# Altium footprint library TarabusLib_KOR.PcbLib: 560 footprints (part 15 of 35)
Each footprint in its own frame and in the unit in brackets; x right, y up, seen from the top. Pads: shape width x height; smd on the part's side, far side on the other; paste and mask are expansions set on the pad; w line width, h text height; cw(c..) or ccw(c..) is an arc to the next point about the centre after c.
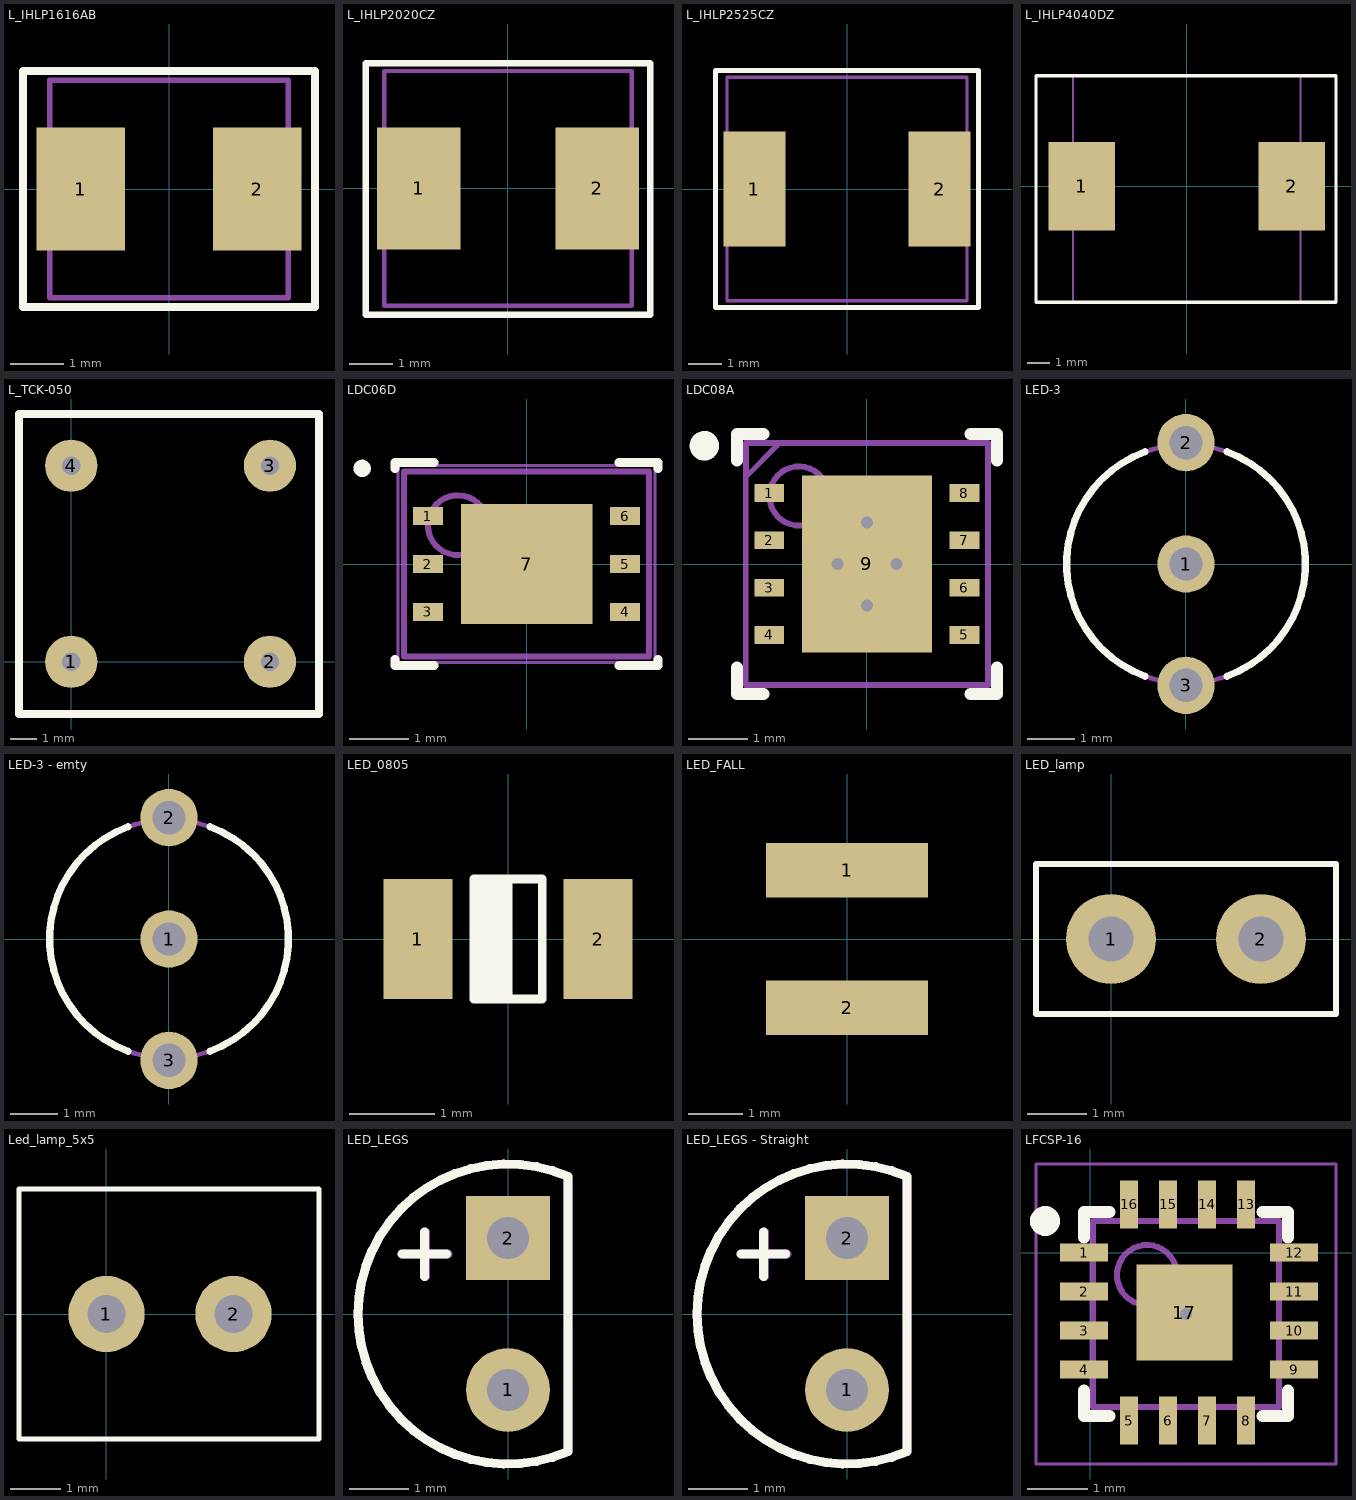
[diagram p14: the footprints below, top view; thin cyan lines are the x and y axes]

## L_IHLP1616AB [mm]
height 1
pads (2):
  rect 1.65x2.3 smd: 1(-1.65,0) 2(1.65,0)
Top Overlay:
  lines w0.15: -2.725,-2.2 -2.725,2.2 2.725,2.2 2.725,-2.2 -2.725,-2.2
Mechanical 7:
  lines w0.1: -2.225,-2.03 2.225,-2.03 2.225,2.03 -2.225,2.03 -2.225,-2.03
Mechanical 10:
  text ".Designator" at -1.425,1.55 h0.8
  text ".Comment" at -1.425,-1.875 h0.6
3D body: height 1.2, standoff 0.05, extent -2.225,-2.025 2.225,2.025

## L_IHLP2020CZ [mm]
height 3
pads (2):
  rect 1.925x2.8 smd: 1(-2.05,0) 2(2.05,0)
Top Overlay:
  lines w0.15: -3.275,-2.9 3.275,-2.9 3.275,2.875 -3.275,2.875 -3.275,-2.9
Mechanical 7:
  lines w0.1: 2.85,-2.7 -2.85,-2.7 -2.85,2.7 2.85,2.7 2.85,-2.7 ; 2.85,-2.7 2.85,-2.7
Mechanical 10:
  text ".Comment" at -1.125,-3.525 h0.6
  text ".Designator" at -1.475,3.125 h0.8
3D body: height 3, standoff 0.05, extent -2.85,-2.7 2.85,2.7

## L_IHLP2525CZ [mm]
height 3
pads (2):
  rect 1.85x3.45 smd: 1(-2.775,0) 2(2.775,0)
Top Overlay:
  lines w0.15: -3.95,-3.55 3.95,-3.55 3.95,3.55 -3.95,3.55 -3.95,-3.55
Mechanical 9:
  text ".Designator" at -1.2,3.9 h0.8
  text ".Comment" at -1.2,-4.3 h0.8
Mechanical 11:
  lines w0.1: -3.6,-3.35 3.6,-3.35 3.6,3.35 -3.6,3.35 -3.6,-3.35
3D body: height 3, standoff 0.05, extent -3.6,-3.35 3.6,3.35

## L_IHLP4040DZ [mm]
height 4
pads (2):
  rect 3x4 smd: 1(-4.75,0) 2(4.75,0)
Top Overlay:
  lines w0.15: -6.825,-5.25 6.75,-5.25 6.75,5 -6.825,5 -6.825,-5.25
Mechanical 9:
  text ".Designator" at -1.6,6 h0.7
  text ".Comment" at -0.8,-6.3 h0.7
Mechanical 11:
  lines w0.1: -5.15,-5.25 5.15,-5.25 5.15,5 -5.15,5 -5.15,-5.25
3D body "IHLP-4040DZ-11.STEP": height 4.2, standoff -0.05, extent -5.397,-5.25 5.397,5.05

## L_TCK-050 [mm]
pads (4):
  round 2 hole 0.7: 1(0,0) 2(7.62,0) 3(7.62,7.52) 4(0,7.52)
Top Overlay:
  lines w0.3: -2,-2 9.5,-2 9.5,9.5 -2,9.5 -2,-2
Mechanical 7:
  lines w0.3: -2,-2 9.5,-2 9.5,9.5 -2,9.5 -2,-2
Mechanical 10:
  text ".Designator" at 6.5,11 h0.8
  text ".Comment" at 6.5,10 h0.6
3D body: height 8.8, standoff 0, extent -2,-2 9.5,9.5

## LDC06D [mm] "PSON, 6-Leads, Body 3x4 mm, Pitch 0.8mm, NSC Recommended"
height 0.8
pads (7):
  rect 0.5x0.3 smd paste-0.15 mask+0.051: 1(-1.65,0.8) 2(-1.65,0) 3(-1.65,-0.8) 4(1.65,-0.8) 5(1.65,0) 6(1.65,0.8)
  rect 2.2x2 smd paste-1 mask+0.051: 7(0,0)
Top Overlay:
  circle w0.15: c-2.75,1.6 r0.069
  lines w0.15: -2.2,-1.7 -2.2,-1.6 ; -2.2,1.6 -2.2,1.7 ; -2.195,-1.7 -1.55,-1.7 ; -2.195,1.7 -1.55,1.7 ; 1.55,-1.7 2.195,-1.7 ; 1.55,1.7 2.195,1.7 ; 2.2,-1.7 2.2,-1.6 ; 2.2,1.6 2.2,1.7
Top Paste:
  region: 2,0.15 1.5,0.15 1.5,-0.15 2,-0.15
  rectangle: -2,-0.15 -1.5,0.15
  rectangle: -2,-0.95 -1.5,-0.65
  region: 2,-0.65 1.5,-0.65 1.5,-0.95 2,-0.95
  region: 2,0.95 1.5,0.95 1.5,0.65 2,0.65
  rectangle: -2,0.65 -1.5,0.95
  region: -0.15,0.9 -1,0.9 -1,0.15 -0.15,0.15
  rectangle: 0.15,-0.9 1,-0.15
  region: -0.15,-0.15 -1,-0.15 -1,-0.9 -0.15,-0.9
  rectangle: 0.15,0.15 1,0.9
Mechanical 7:
  lines w0.05: -2.15,-1.65 -2.15,1.65 2.15,1.65 2.15,-1.65 -2.15,-1.65
  lines w0.1: -0.5,0 0.5,0 ; 0,-0.5 0,0.5
Mechanical 9:
  circle w0.1: c-1.15,0.65 r0.5
  lines w0.1: -2.05,-1.55 2.05,-1.55 2.05,1.55 -2.05,1.55 -2.05,-1.55
3D body: height 0.8, standoff 0, extent -2.049,-1.549 2.049,1.549

## LDC08A [mm] "PSON, 8-Leads, Body 4x4mm, Pitch 0.8mm, NSC Recommended"
height 0.8
pads (9):
  rect 0.5x0.3 smd mask+0.051: 1(-1.65,1.2) 2(-1.65,0.4) 3(-1.65,-0.4) 4(-1.65,-1.2) 5(1.65,-1.2) 6(1.65,-0.4) 7(1.65,0.4) 8(1.65,1.2)
  rect 2.2x3 smd paste-1.5 mask+0.051: 9(0,0)
via 0,-0.7 diameter 0.5 hole 0.2
via 0,0.7 diameter 0.5 hole 0.2
via 0.5,0 diameter 0.5 hole 0.2
via -0.5,0 diameter 0.5 hole 0.2
Top Overlay:
  circle w0.25: c-2.75,2 r0.125
  lines w0.2: -2.2,-1.75 -2.2,-2.2 -1.75,-2.2 ; -2.2,1.75 -2.2,2.2 -1.75,2.2 ; 1.75,-2.2 2.2,-2.2 2.2,-1.75 ; 1.75,2.2 2.2,2.2 2.2,1.75
Top Paste:
  region: 1,-0.15 0.15,-0.15 0.15,-1.4 1,-1.4
  rectangle: -1,-1.4 -0.15,-0.15
  rectangle: -1,0.15 -0.15,1.4
  region: 1,1.4 0.15,1.4 0.15,0.15 1,0.15
Mechanical 7:
  lines w0.05: -2.05,1.45 -1.45,2.05 ; -2.05,2.029 -1.494,2.029 ; -2.037,1.513 -1.525,2.025 ; -2.021,1.494 -2.021,2.05 ; -2.05,-2.05 -2.05,2.057 2.05,2.057 2.05,-2.05 -2.05,-2.05
  lines w0.1: -0.5,0 0.5,0 ; 0,-0.5 0,0.5
Mechanical 9:
  circle w0.1: c-1.15,1.15 r0.5
  lines w0.1: -2.05,-2.05 -2.05,2.05 2.05,2.05 2.05,-2.05 -2.05,-2.05
Mechanical 10:
  text ".Designator" at -0.9,-2.8 h0.6
  text ".Comment" at -0.9,2.5 h0.6
3D body: height 0.8, standoff 0, extent -2.05,-2.05 2.05,2.05

## LED-3 [mm]
pads (3):
  round 1.2 hole 0.7: 1(0,0) 2(0,2.54) 3(0,-2.54)
Top Overlay:
  lines w0.15: -0.855,-2.349 cw(c0,0) -0.855,2.349 ; 0.855,-2.349 ccw(c0,0) 0.855,2.349
Mechanical 7:
  circle w0.1: c0,0 r2.5
Mechanical 10:
  text ".Comment" at -0.5,-3.875 h0.6
  text ".Designator" at -0.625,3.575 h0.8
3D body "L-3WEGW.STEP": height 7, standoff -9.53, extent -1.85,-2.815 2.15,2.765

## LED-3 - emty [mm]
pads (3):
  round 1.2 hole 0.7: 1(0,0) 2(0,2.54) 3(0,-2.54)
Top Overlay:
  lines w0.15: -0.855,-2.349 cw(c0,0) -0.855,2.349 ; 0.855,-2.349 ccw(c0,0) 0.855,2.349
Mechanical 9:
  text ".Comment" at -0.5,-3.875 h0.6
  text ".Designator" at -0.625,3.575 h0.8
Mechanical 11:
  circle w0.1: c0,0 r2.5

## LED_0805 [mm]
pads (2):
  rect 0.8x1.4 smd: 1(-1.05,0) 2(1.05,0)
Top Overlay:
  rectangle: -0.4,-0.7 0,0.7
  lines w0.1: 0,-0.7 0,0.7 ; -0.4,-0.7 0.4,-0.7 0.4,0.7 -0.4,0.7 -0.4,-0.7
3D body "LED-0805.step": height 0.75, standoff -0.05, extent -0.975,-0.625 1.025,0.625

## LED_FALL [mm]
pads (2):
  rect 3x1 smd: 1(0,1.27) 2(0,-1.27)

## LED_lamp [mil] "Rectangular Type LED lamp"
pads (2):
  round 60 hole 30: 1(0,0) 2(100,0)
Top Overlay:
  lines w3.94: -50,-50 150,-50 150,50 -50,50 -50,-50
3D body "Rectangular Type LED lamp (зеленый).STEP": height 275.59, standoff -1000, extent -49.21,-53.15 147.64,53.15

## Led_lamp_5x5 [mil]
pads (2):
  round 60 hole 30: 1(0,0) 2(100,0)
Top Overlay:
  lines w3.94: -59.06,98.43 157.48,98.43 ; 167.32,78.74 167.32,-78.74 ; 157.48,98.43 -68.9,98.43 -68.9,78.74 -68.9,0 -68.9,-78.74 -68.9,-98.43 -59.06,-98.43 157.48,-98.43 167.32,-98.43 167.32,-78.74 ; 157.48,98.43 167.32,98.43 167.32,-78.74
3D body "5x5mm SQUARE TOP LED LAMP (красный).STEP": height 283.46, standoff -1062.99, extent -68.9,-98.43 167.32,98.43

## LED_LEGS [mm]
height 7.6
pads (2):
  round 1.4 hole 0.7: 1(0,-1.27)
  rect 1.4x1.4 hole 0.7: 2(0,1.27)
Top Overlay:
  lines w0.15: -1.775,1 -1.025,1 ; -1.4,0.625 -1.4,1.375 ; 1,-2.3 cw(c0,0) 1,2.3 1,-2.3
Mechanical 7:
  lines w0.15: -1.75,1 -1,1 ; -1.375,0.625 -1.375,1.375 ; 1,-2.3 cw(c0,0) 1,2.3 1,-2.3
Mechanical 10:
  text ".Designator" at 1,2.5 h0.8
  text ".Comment" at 0.25,-3.5 h0.6
3D body "ИК светодиод L-34SF4C.STEP": height 2.15, standoff -1.65, extent -0.099,-1.9 7.699,1.9

## LED_LEGS - Straight [mm]
height 7.6
pads (2):
  round 1.4 hole 0.7: 1(0,-1.27)
  rect 1.4x1.4 hole 0.7: 2(0,1.27)
Top Overlay:
  lines w0.15: -1.775,1 -1.025,1 ; -1.4,0.625 -1.4,1.375 ; 1,-2.3 cw(c0,0) 1,2.3 1,-2.3
Mechanical 7:
  lines w0.15: -1.75,1 -1,1 ; -1.375,0.625 -1.375,1.375 ; 1,-2.3 cw(c0,0) 1,2.3 1,-2.3
Mechanical 10:
  text ".Designator" at 1,2.5 h0.8
  text ".Comment" at 0.25,-3.5 h0.6
3D body "ПН_L-1344GT.STEP": height 7, standoff -4, extent -2.175,-2.025 1.825,1.975

## LFCSP-16 [mm]
pads (17):
  rect 0.8x0.3 smd: 1(-0.1,0) 2(-0.1,-0.65) 3(-0.1,-1.3) 4(-0.1,-1.95) 9(3.4,-1.95) 10(3.4,-1.3) 11(3.4,-0.65) 12(3.4,0)
  rect 0.3x0.8 smd: 5(0.65,-2.8) 6(1.3,-2.8) 7(1.95,-2.8) 8(2.6,-2.8) 13(2.6,0.8) 14(1.95,0.8) 15(1.3,0.8) 16(0.65,0.8)
  rect 1.6x1.6 smd: 17(1.575,-1)
via 1.6,-1.025 diameter 0.5 hole 0.2
Top Overlay:
  circle w0.25: c-0.75,0.525 r0.125
  lines w0.2: -0.1,-2.3 -0.1,-2.725 0.325,-2.725 ; -0.1,0.25 -0.1,0.675 0.325,0.675 ; 2.875,-2.725 3.3,-2.725 3.3,-2.3 ; 2.875,0.675 3.3,0.675 3.3,0.25
Mechanical 13:
  circle w0.1: c0.95,-0.375 r0.5
  lines w0.1: 0.05,-2.575 0.05,0.525 3.15,0.525 3.15,-2.575 0.05,-2.575
Mechanical 15:
  lines w0.05: -0.9,-3.525 -0.9,1.475 4.1,1.475 4.1,-3.525 -0.9,-3.525
  lines w0.1: 1.1,-1.025 2.1,-1.025 ; 1.6,-1.525 1.6,-0.525
3D body "LFCSP16.STEP": height 1, standoff 0, extent -0.375,-2.975 3.625,1.025